# Altium footprint library Devkit.PcbLib: 84 footprints (part 1 of 6)
Each footprint in its own frame and in the unit in brackets; x right, y up, seen from the top. Pads: shape width x height; smd on the part's side, far side on the other; paste and mask are expansions set on the pad; w line width, h text height; cw(c..) or ccw(c..) is an arc to the next point about the centre after c.
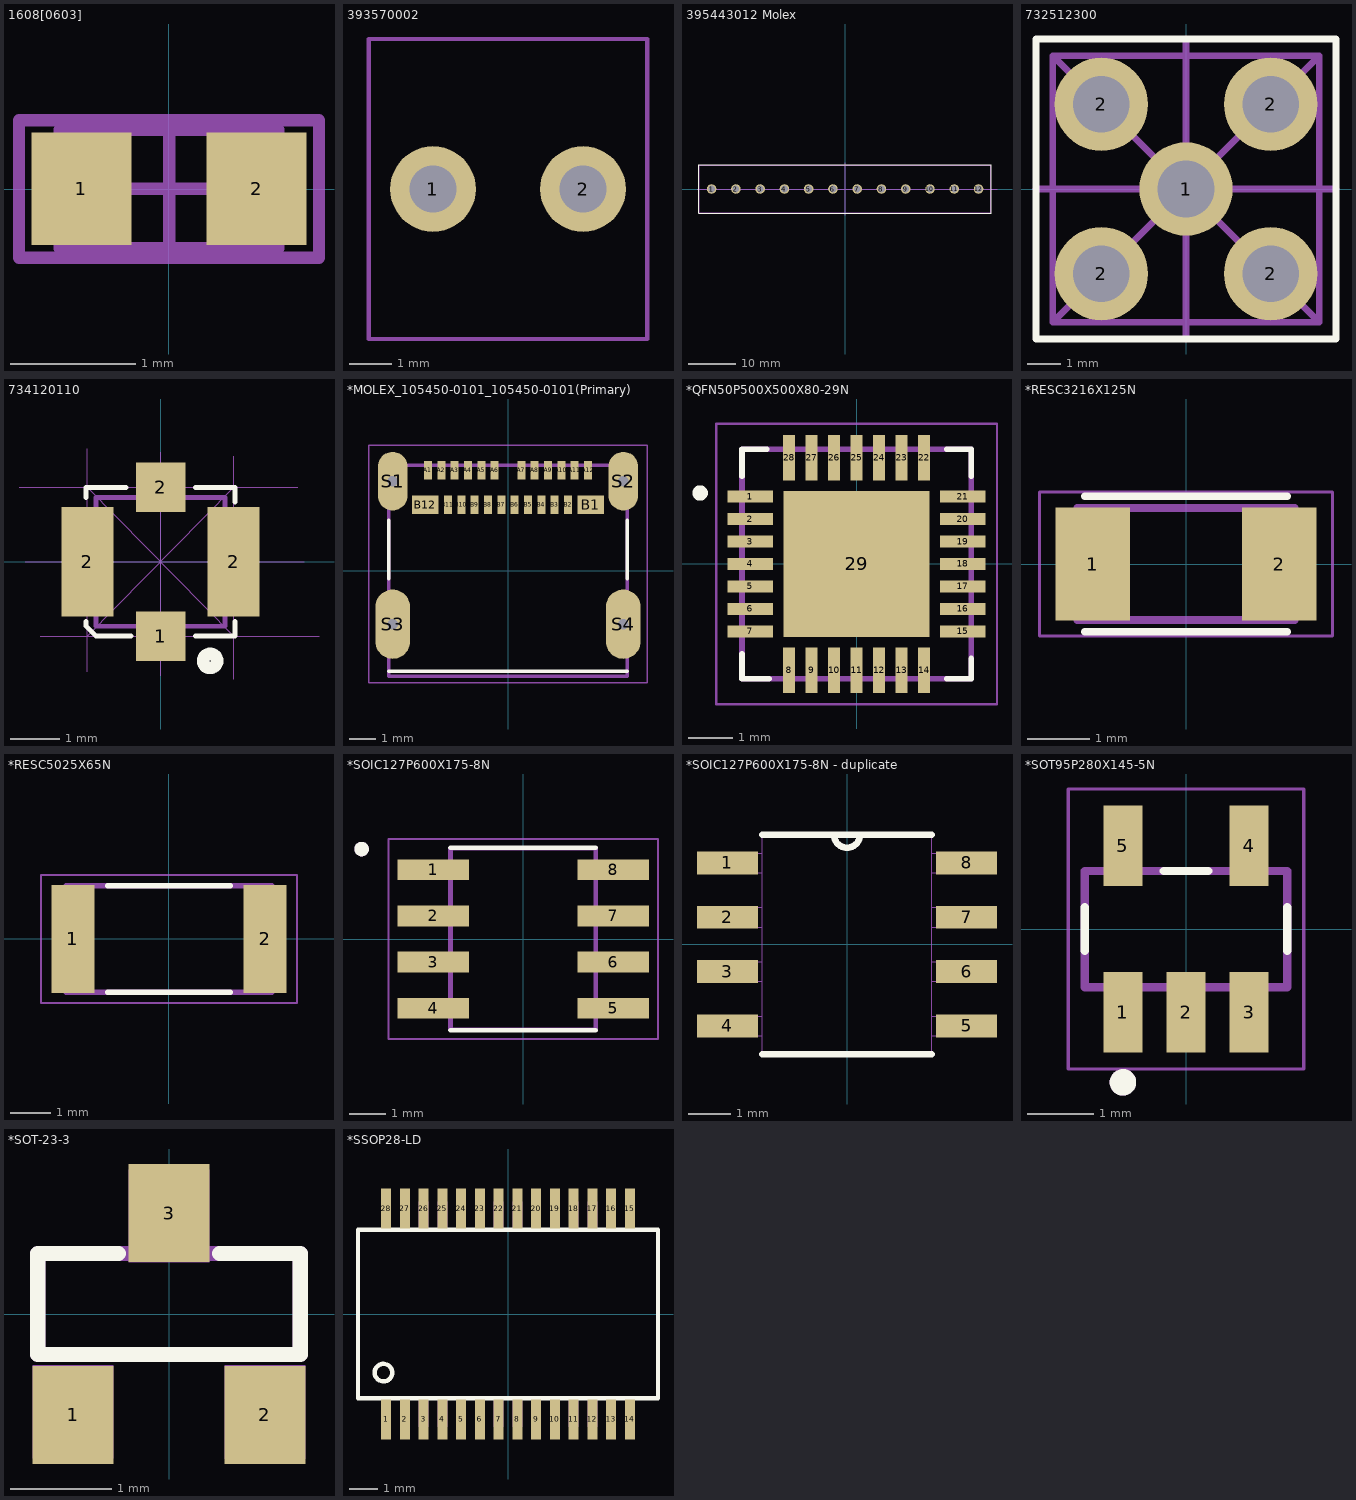
[diagram p0: the footprints below, top view; thin cyan lines are the x and y axes]

## 1608[0603] [mm] "Chip Capacitor, Body 1.6x0.8mm, IPC High Density"
height 1.3
pads (2):
  rect 0.8x0.9 smd: 1(-0.7,0) 2(0.7,0)
Mechanical 13:
  lines w0.1: -0.875,-0.475 0.875,-0.475 0.875,0.475 -0.875,0.475 -0.875,-0.475
Mechanical 15:
  lines w0.1: -0.475,0 0.475,0 ; 0,-0.475 0,0.475 ; -1.2,-0.55 1.2,-0.55 1.2,0.55 -1.2,0.55 -1.2,-0.55
3D body: height 1.3, standoff 0, extent -0.875,-0.475 0.875,0.475

## 393570002 [mm]
pads (2):
  round 2 hole 1.1: 1(15,8) 2(18.5,8)
Mechanical 2:
  lines w0.1: 13.5,4.5 20,4.5 20,11.5 13.5,11.5 13.5,8 13.5,4.5
3D body "393570002.stp": height 8.51, standoff -3.51, extent 13.188,4.5 20.3,11.79

## 395443012 Molex [mm] "5.08mm Pitch Eurostyle Vertical Fixed Mount PCB Terminal Block, 12 Circuits"
height 14
pads (12):
  round 2 hole 1.4: 1(-27.938,0) 2(-22.858,0) 3(-17.778,0) 4(-12.698,0) 5(-7.618,0) 6(-2.538,0) 7(2.542,0) 8(7.622,0) 9(12.702,0) 10(17.782,0) 11(22.862,0) 12(27.942,0)
Top Overlay:
  lines w0.2: -30.6,-5.125 30.6,-5.125 30.6,5.125 -30.6,5.125 -30.6,-5.125
Mechanical 2:
  lines w0.01: -30.813,0 31.812,0 ; 0,-5.125 0,5.125 ; -30.48,-5 30.48,-5 30.48,5 -30.48,5 -30.48,-5
Mechanical 15:
  lines w0.01: -31,0 31,0 ; 0,-5.5 0,5.5 ; -30.48,-5 30.48,-5 30.48,5 -30.48,5 -30.48,-5
3D body "395443012.stp": height 14.5, standoff -3.02, extent -30.48,-4.953 30.48,4.953

## 732512300 [mm]
pads (5):
  round 2.8 hole 1.7: 1(0,0) 2(-2.54,-2.54) 2(-2.54,2.54) 2(2.54,-2.54) 2(2.54,2.54)
Top Overlay:
  lines w0.2: -4.5,-4.5 4.5,-4.5 4.5,4.5 -4.5,4.5 -4.5,-4.5
Mechanical 15:
  lines w0.2: -4.5,0 4.5,0 ; 0,-4.5 0,4.5 ; -4,-4 4,-4 ; -4,-4 -4,4 ; -4,-4 4,4 ; -4,4 4,4 ; -4,4 4,-4 ; 4,-4 4,4
3D body "molex.STEP": height 9.76, standoff -3.94, extent -3.175,-3.175 3.175,3.175

## 734120110 [mm]
pads (4):
  rect 1x1 smd: 1(0,-1.5) 2(0,1.5)
  rect 1.05x2.2 smd: 2(-1.475,0) 2(1.475,0)
Top Overlay:
  circle w0.254: c1,-2 r0.141
  lines w0.1: -1.5,-1.2 -1.5,-1.3 -1.3,-1.5 -0.6,-1.5 ; -1.5,1.3 -1.5,1.5 -0.7,1.5 ; 0.7,-1.5 1.5,-1.5 1.5,-1.2 ; 0.7,1.5 1.5,1.5 1.5,1.2
Mechanical 1:
  lines w0.1: -1.3,-1.3 -1.3,1.3 1.3,1.3 1.3,-1.3 -1.3,-1.3
Mechanical 2:
  lines w0.01: -2.855,1.5 2.77,1.5 ; -2.73,0 2.895,0 ; -2.43,-1.5 3.195,-1.5 ; -1.475,-2.22 -1.475,2.28 ; -1.475,-1.5 1.475,1.5 ; -1.475,1.5 1.475,-1.5 ; 0,-2.295 0,2.205 ; 1.475,-2.37 1.475,2.13
3D body "734120110.stp": height 1.28, standoff -0.02, extent -1.5,-1.54 1.5,1.54

## *MOLEX_105450-0101_105450-0101(Primary) [mm]
pads (28):
  rect 0.3x0.7 smd: A1(-3,3.77) A2(-2.5,3.77) A3(-2,3.77) A4(-1.5,3.77) A5(-1,3.77) A6(-0.5,3.77) A7(0.5,3.77) A8(1,3.77) A9(1.5,3.77) A10(2,3.77) A11(2.5,3.77) A12(3,3.77) B2(2.25,2.47) B3(1.75,2.47) B4(1.25,2.47) B5(0.75,2.47) B6(0.25,2.47) B7(-0.25,2.47) B8(-0.75,2.47) B9(-1.25,2.47) B10(-1.75,2.47) B11(-2.25,2.47)
  rect 1x0.7 smd: B1(3.1,2.47) B12(-3.1,2.47)
  oval 1.1x2.2 hole 0.4 square: S1(-4.32,3.36) S2(4.32,3.36)
  oval 1.3x2.6 hole 0.4 square: S3(-4.32,-2) S4(4.32,-2)
Top Overlay:
  lines w0.127: -4.47,-3.77 4.47,-3.77 ; -4.47,-0.3 -4.47,1.9 ; 4.47,-0.3 4.47,1.9
Mechanical 2:
  lines w0: -4.62,-2.75 ccw(c-4.32,-2.75) -4.32,-3.05 ccw(c-4.32,-2.75) -4.02,-2.75 -4.02,-1.25 ccw(c-4.32,-1.25) -4.32,-0.95 ccw(c-4.32,-1.25) -4.62,-1.25 -4.62,-2.75 ; -4.62,2.86 ccw(c-4.32,2.86) -4.32,2.56 ccw(c-4.32,2.86) -4.02,2.86 -4.02,3.86 ccw(c-4.32,3.86) -4.32,4.16 ccw(c-4.32,3.86) -4.62,3.86 -4.62,2.86 ; 4.02,-2.75 ccw(c4.32,-2.75) 4.32,-3.05 ccw(c4.32,-2.75) 4.62,-2.75 4.62,-1.25 ccw(c4.32,-1.25) 4.32,-0.95 ccw(c4.32,-1.25) 4.02,-1.25 4.02,-2.75 ; 4.02,2.86 ccw(c4.32,2.86) 4.32,2.56 ccw(c4.32,2.86) 4.62,2.86 4.62,3.86 ccw(c4.32,3.86) 4.32,4.16 ccw(c4.32,3.86) 4.02,3.86 4.02,2.86
Mechanical 4:
  lines w0.127: -4.47,-3.95 4.47,-3.95 ; -4.47,-3.95 -4.47,3.95 ; -4.47,-3.95 4.47,-3.95 ; -4.47,-3.95 -4.47,3.95 ; -4.47,3.95 4.47,3.95 ; -4.47,3.95 4.47,3.95 ; 4.47,-3.95 4.47,3.95 ; 4.47,-3.95 4.47,3.95
Mechanical 16:
  lines w0.05: -5.22,-4.2 5.22,-4.2 5.22,4.71 -5.22,4.71 -5.22,-4.2
3D body "1054500101.stp": height 3.18, standoff -0.78, extent -4.47,-3.95 4.47,3.95

## *QFN50P500X500X80-29N [mm]
pads (29):
  rect 1.01x0.27 smd: 1(-2.36,1.5) 2(-2.36,1) 3(-2.36,0.5) 4(-2.36,0) 5(-2.36,-0.5) 6(-2.36,-1) 7(-2.36,-1.5) 15(2.36,-1.5) 16(2.36,-1) 17(2.36,-0.5) 18(2.36,0) 19(2.36,0.5) 20(2.36,1) 21(2.36,1.5)
  rect 0.27x1.01 smd: 8(-1.5,-2.36) 9(-1,-2.36) 10(-0.5,-2.36) 11(0,-2.36) 12(0.5,-2.36) 13(1,-2.36) 14(1.5,-2.36) 22(1.5,2.36) 23(1,2.36) 24(0.5,2.36) 25(0,2.36) 26(-0.5,2.36) 27(-1,2.36) 28(-1.5,2.36)
  rect 3.25x3.25 smd: 29(0,0)
Top Overlay:
  circle w0.2: c-3.478,1.578 r0.07
  lines w0.127: -2.55,-2 -2.55,-2.55 -1.95,-2.55 ; -2.55,1.95 -2.55,2.55 -2,2.55 ; 2,-2.55 2.55,-2.55 2.55,-2.1 ; 2,2.55 2.55,2.55 2.55,1.95
Top Paste:
  region: 1.331,-0.181 1.331,-1.331 0.179,-1.331 0.179,-0.181
  region: -0.18,-1.331 -1.331,-1.331 -1.331,-0.18 -0.18,-0.18
  region: -1.331,0.179 -1.331,1.331 -0.181,1.331 -0.181,0.179
  region: 0.18,1.33 1.33,1.33 1.33,0.18 0.18,0.18
Mechanical 4:
  lines w0.127: -2.55,-2.55 -2.55,2.55 ; -2.55,-2.55 2.55,-2.55 ; -2.55,-2.55 -2.55,2.55 ; -2.55,-2.55 2.55,-2.55 ; -2.55,2.55 2.55,2.55 ; -2.55,2.55 2.55,2.55 ; 2.55,-2.55 2.55,2.55 ; 2.55,-2.55 2.55,2.55
Mechanical 16:
  lines w0.05: -3.12,-3.12 -3.12,3.12 3.12,3.12 3.12,-3.12 -3.12,-3.12
3D body: height 1, standoff 0, extent -3.175,-3.175 3.175,3.175

## *RESC3216X125N [mm]
pads (2):
  rect 1.2x1.82 smd: 1(-1.505,0) 2(1.505,0)
Top Overlay:
  lines w0.127: -1.63,-1.09 1.63,-1.09 ; -1.63,1.09 1.63,1.09
Mechanical 4:
  lines w0.127: -1.75,-0.9 -1.75,0.9 ; -1.75,-0.9 1.75,-0.9 ; -1.75,-0.9 -1.75,0.9 ; -1.75,-0.9 1.75,-0.9 ; -1.75,0.9 1.75,0.9 ; -1.75,0.9 1.75,0.9 ; 1.75,-0.9 1.75,0.9 ; 1.75,-0.9 1.75,0.9
Mechanical 16:
  lines w0.05: -2.36,-1.16 -2.36,1.16 2.36,1.16 2.36,-1.16 -2.36,-1.16
3D body: height 2, standoff 0, extent -2.4,-1.2 2.4,1.2

## *RESC5025X65N [mm]
pads (2):
  rect 1.07x2.67 smd: 1(-2.38,0) 2(2.38,0)
Top Overlay:
  lines w0.127: -1.52,-1.32 1.52,-1.32 ; -1.52,1.32 1.52,1.32
Mechanical 4:
  lines w0.127: -2.55,-1.32 -2.55,1.32 ; -2.55,-1.32 2.55,-1.32 ; -2.55,-1.32 -2.55,1.32 ; -2.55,-1.32 2.55,-1.32 ; -2.55,1.32 2.55,1.32 ; -2.55,1.32 2.55,1.32 ; 2.55,-1.32 2.55,1.32 ; 2.55,-1.32 2.55,1.32
Mechanical 16:
  lines w0.05: -3.165,-1.585 -3.165,1.585 3.165,1.585 3.165,-1.585 -3.165,-1.585
3D body: height 2, standoff 0, extent -3.2,-1.6 3.2,1.6

## *SOIC127P600X175-8N [mm]
pads (8):
  rect 1.97x0.57 smd: 1(-2.475,1.905) 2(-2.475,0.635) 3(-2.475,-0.635) 4(-2.475,-1.905) 5(2.475,-1.905) 6(2.475,-0.635) 7(2.475,0.635) 8(2.475,1.905)
Top Overlay:
  circle w0.2: c-4.445,2.475 r0.1
  lines w0.127: -2,-2.51 2,-2.51 ; -2,2.51 2,2.51
Mechanical 4:
  circle w0.2: c-4.445,2.475 r0.1
  circle w0.2: c-4.445,2.475 r0.1
  lines w0.127: -2,-2.5 -2,2.5 ; -2,-2.5 2,-2.5 ; -2,-2.5 -2,2.5 ; -2,-2.5 2,-2.5 ; -2,2.5 2,2.5 ; -2,2.5 2,2.5 ; 2,-2.5 2,2.5 ; 2,-2.5 2,2.5
Mechanical 16:
  lines w0.05: -3.71,-2.75 -3.71,2.75 3.71,2.75 3.71,-2.75 -3.71,-2.75
3D body "THVD1429DT--3DModel-STEP-56544.STEP": height 1.74, standoff -0.01, extent -2.997,-2.451 2.997,2.451

## *SOIC127P600X175-8N - duplicate [mil]
pads (8):
  rect 56x21 smd: 1(-110,75) 2(-110,25) 3(-110,-25) 4(-110,-75) 5(110,-75) 6(110,-25) 7(110,25) 8(110,75)
Top Overlay:
  lines w6: -78,-101 78,-101 ; -78,101 -12,101 ; 78,101 12,101 ; -12,101 ccw(c0,101) 12,101 ; -12,101 12,101
Mechanical 4:
  lines w0: -124,-84 -124,-66 ; -124,-84 -78,-84 ; -124,-84 -124,-66 ; -124,-84 -78,-84 ; -124,-66 -78,-66 ; -124,-66 -78,-66 ; -124,-34 -124,-16 ; -124,-34 -78,-34 ; -124,-34 -124,-16 ; -124,-34 -78,-34 ; -124,-16 -78,-16 ; -124,-16 -78,-16 ; -124,16 -124,34 ; -124,16 -78,16 ; -124,16 -124,34 ; -124,16 -78,16 ; -124,34 -78,34 ; -124,34 -78,34 ; -124,66 -124,84 ; -124,66 -78,66 ; -124,66 -124,84 ; -124,66 -78,66 ; -124,84 -78,84 ; -124,84 -78,84 ; -78,-101 78,-101 ; -78,-101 -78,101 ; -78,-101 78,-101 ; -78,-101 -78,101 ; -78,-84 -78,-66 ; -78,-84 -78,-66 ; -78,-34 -78,-16 ; -78,-34 -78,-16 ; -78,16 -78,34 ; -78,16 -78,34 ; -78,66 -78,84 ; -78,66 -78,84 ; -78,101 -12,101 ; -78,101 -12,101 ; -12,101 ccw(c0,101) 12,101 ; -12,101 ccw(c0,101) 12,101 ; -12,101 12,101 ; -12,101 12,101 ; 12,101 78,101 ; 12,101 78,101 ; 78,-101 78,101 ; 78,-101 78,101 ; 78,-84 78,-66 ; 78,-84 124,-84 ; 78,-84 78,-66 ; 78,-84 124,-84 ; 78,-66 124,-66 ; 78,-66 124,-66 ; 78,-34 78,-16 ; 78,-34 124,-34 ; 78,-34 78,-16 ; 78,-34 124,-34 ; 78,-16 124,-16 ; 78,-16 124,-16 ; 78,16 78,34 ; 78,16 124,16 ; 78,16 78,34 ; 78,16 124,16 ; 78,34 124,34 ; 78,34 124,34 ; 78,66 78,84 ; 78,66 124,66 ; 78,66 78,84 ; 78,66 124,66 ; 78,84 124,84 ; 78,84 124,84 ; 124,-84 124,-66 ; 124,-84 124,-66 ; 124,-34 124,-16 ; 124,-34 124,-16 ; 124,16 124,34 ; 124,16 124,34 ; 124,66 124,84 ; 124,66 124,84
3D body "THVD1429DT--3DModel-STEP-56544.STEP": height 68.68, standoff -0.32, extent -118,-96.5 118,96.5

## *SOT95P280X145-5N [mm]
pads (5):
  rect 0.59x1.21 smd: 1(-0.95,-1.255) 2(0,-1.255) 3(0.95,-1.255) 4(0.95,1.255) 5(-0.95,1.255)
Top Overlay:
  circle w0.2: c-0.95,-2.31 r0.1
  lines w0.127: -1.525,-0.33 -1.525,0.33 ; -0.335,0.875 0.335,0.875 ; 1.525,-0.33 1.525,0.33
Mechanical 4:
  circle w0.2: c-0.95,-2.31 r0.1
  circle w0.2: c-0.95,-2.31 r0.1
  lines w0.127: -1.525,-0.875 -1.525,0.875 ; -1.525,-0.875 1.525,-0.875 ; -1.525,-0.875 -1.525,0.875 ; -1.525,-0.875 1.525,-0.875 ; -1.525,0.875 1.525,0.875 ; -1.525,0.875 1.525,0.875 ; 1.525,-0.875 1.525,0.875 ; 1.525,-0.875 1.525,0.875
Mechanical 16:
  lines w0.05: -1.775,-2.11 1.775,-2.11 1.775,2.11 -1.775,2.11 -1.775,-2.11
3D body "TLV704.STEP": height 1.4, standoff -0.05, extent -1.442,-1.4 1.458,1.4

## *SOT-23-3 [mm]
pads (3):
  rect 0.802x0.972 smd: 1(-0.95,-1) 2(0.95,-1) 3(0,1)
Top Overlay:
  lines w0.15: -0.5,0.6 -1.3,0.6 -1.3,-0.4 1.3,-0.4 1.3,0.6 0.5,0.6
Mechanical 4:
  region: -0.401,1.43 0.4,1.43 0.4,0.511 -0.401,0.511
  region: 0.551,-0.51 1.35,-0.51 1.35,-1.432 0.551,-1.432
  region: -1.351,-0.51 -0.55,-0.51 -0.55,-1.431 -1.351,-1.431
  region: -1.351,-0.51 -0.55,-0.51 -0.55,-1.431 -1.351,-1.431
  region: 0.551,-0.51 1.35,-0.51 1.35,-1.432 0.551,-1.432
  region: -0.401,1.43 0.4,1.43 0.4,0.511 -0.401,0.511
  region: -0.401,1.43 0.4,1.43 0.4,0.511 -0.401,0.511
  region: 0.551,-0.51 1.35,-0.51 1.35,-1.432 0.551,-1.432
  region: -1.351,-0.51 -0.55,-0.51 -0.55,-1.431 -1.351,-1.431
  region: -1.351,-0.51 -0.55,-0.51 -0.55,-1.431 -1.351,-1.431
  region: 0.551,-0.51 1.35,-0.51 1.35,-1.432 0.551,-1.432
  region: -0.401,1.43 0.4,1.43 0.4,0.511 -0.401,0.511
  lines w0.15: -1.3,-0.4 1.3,-0.4 ; -1.3,-0.4 -1.3,0.6 ; -1.3,-0.4 1.3,-0.4 ; -1.3,-0.4 -1.3,0.6 ; -1.3,-0.4 1.3,-0.4 ; -1.3,-0.4 -1.3,0.6 ; -1.3,-0.4 1.3,-0.4 ; -1.3,-0.4 -1.3,0.6 ; -1.3,0.6 1.3,0.6 ; -1.3,0.6 1.3,0.6 ; -1.3,0.6 1.3,0.6 ; -1.3,0.6 1.3,0.6 ; 1.3,-0.4 1.3,0.6 ; 1.3,-0.4 1.3,0.6 ; 1.3,-0.4 1.3,0.6 ; 1.3,-0.4 1.3,0.6
3D body "cdsot23-SM712.stp": height 1.1, standoff 0.04, extent -1.46,-1.15 1.46,1.15

## *SSOP28-LD [mm]
pads (28):
  rect 0.348x1.397 smd: 1(-4.225,-3.656) 2(-3.575,-3.656) 3(-2.925,-3.656) 4(-2.275,-3.656) 5(-1.625,-3.656) 6(-0.975,-3.656) 7(-0.325,-3.656) 8(0.325,-3.656) 9(0.975,-3.656) 10(1.625,-3.656) 11(2.275,-3.656) 12(2.925,-3.656) 13(3.575,-3.656) 14(4.225,-3.656) 15(4.225,3.656) 16(3.575,3.656) 17(2.925,3.656) 18(2.275,3.656) 19(1.625,3.656) 20(0.975,3.656) 21(0.325,3.656) 22(-0.325,3.656) 23(-0.975,3.656) 24(-1.625,3.656) 25(-2.275,3.656) 26(-2.925,3.656) 27(-3.575,3.656) 28(-4.225,3.656)
Top Overlay:
  circle w0.152: c-4.318,-2.032 r0.305
  lines w0.152: -5.2,-2.925 5.2,-2.925 5.2,2.925 -5.2,2.925 -5.2,-2.925
Mechanical 4:
  drawing of 56 lines, arcs and shapes, not listed
3D body: height 1, standoff 0, extent -5.207,-2.921 5.207,2.921

## BAT_ER 14335 [mm]
3D body: height 15.35, standoff 2.85, extent -6.25,-16.75 6.25,-16.25
3D body: height 11.3, standoff 6.9, extent -2.2,16.05 2.2,16.75
3D body: height 16.35, standoff 1.85, extent -7.25,6.05 7.25,16.05
3D body: height 16.35, standoff 1.85, extent -7.25,-16.25 7.25,6.05

## BAT_ER 17505 [mm] "Li-ion battery 17.5x50.5__3.6V_3.6A/h"
height 17.5
3D body: height 17.84, standoff 0.36, extent -8.75,-24.75 8.75,24.75
3D body: height 11.3, standoff 6.9, extent -2.2,24.75 2.2,25.25
3D body: height 15.35, standoff 2.85, extent -6.25,-25.25 6.25,-24.75